# Altium footprint library 7-Connectors-12.PcbLib: 76 footprints (part 3 of 5) (continued)
## MOLEX_47082-1000 [mm] "1.27mm (.050\") Pitch, Surface Mount with Shell, Right Angle, External Metal-Shielded, Serial ATA Plug (SATA)" (continued)
Mechanical 8:
  circle w0.1: c-7.2,-1.935 r0.7
  circle w0.1: c7.2,-2.835 r0.85
  circle w0.1: c9.02,-8.435 r0.85
  circle w0.1: c9.02,0.515 r0.85
  circle w0.1: c-9.38,0.515 r0.85
  circle w0.1: c-9.38,-8.435 r0.85
  circle w0.1: c9.02,0.515 r1.2
  circle w0.1: c-9.38,0.515 r1.2
  circle w0.1: c-9.38,-8.435 r1.2
  circle w0.1: c9.02,-8.435 r1.2
  circle w0.1: c-7.2,-1.935 r1.05
  lines w0.1: -9.88,-8.435 -9.38,-8.435 ; -9.88,0.515 -9.38,0.515 ; -9.38,-8.935 -9.38,-8.435 ; -9.38,-7.935 -9.38,-8.435 ; -9.38,0.015 -9.38,0.515 ; -9.38,1.015 -9.38,0.515 ; -8.88,-8.435 -9.38,-8.435 ; -8.88,0.515 -9.38,0.515 ; -7.7,-1.935 -7.2,-1.935 ; -7.2,-2.435 -7.2,-1.935 ; -7.2,-1.435 -7.2,-1.935 ; -6.7,-1.935 -7.2,-1.935 ; -4.31,0 -3.81,0 ; -3.81,-0.5 -3.81,0 ; -3.81,0.5 -3.81,0 ; -3.31,0 -3.81,0 ; -3.04,0 -2.54,0 ; -2.54,-0.5 -2.54,0 ; -2.54,0.5 -2.54,0 ; -2.04,0 -2.54,0 ; -1.77,0 -1.27,0 ; -1.27,-0.5 -1.27,0 ; -1.27,0.5 -1.27,0 ; -0.77,0 -1.27,0 ; -0.5,0 0,0 ; 0,-0.5 0,0 ; 0,0.5 0,0 ; 0.5,0 0,0 ; 0.77,0 1.27,0 ; 1.27,-0.5 1.27,0 ; 1.27,0.5 1.27,0 ; 1.77,0 1.27,0 ; 2.04,0 2.54,0 ; 2.54,-0.5 2.54,0 ; 2.54,0.5 2.54,0 ; 3.04,0 2.54,0 ; 3.31,0 3.81,0 ; 3.81,-0.5 3.81,0 ; 3.81,0.5 3.81,0 ; 4.31,0 3.81,0 ; 6.7,-2.835 7.2,-2.835 ; 7.2,-3.335 7.2,-2.835 ; 7.2,-2.335 7.2,-2.835 ; 7.7,-2.835 7.2,-2.835 ; 8.52,-8.435 9.02,-8.435 ; 8.52,0.515 9.02,0.515 ; 9.02,-8.935 9.02,-8.435 ; 9.02,-7.935 9.02,-8.435 ; 9.02,0.015 9.02,0.515 ; 9.02,1.015 9.02,0.515 ; 9.52,-8.435 9.02,-8.435 ; 9.52,0.515 9.02,0.515 ; -4.11,-0.835 -4.11,0.865 -3.51,0.865 -3.51,-0.835 -4.11,-0.835 ; -2.84,-0.835 -2.24,-0.835 -2.24,0.865 -2.84,0.865 -2.84,-0.835 ; -1.57,-0.835 -0.97,-0.835 -0.97,0.865 -1.57,0.865 -1.57,-0.835 ; -0.3,-0.835 0.3,-0.835 0.3,0.865 -0.3,0.865 -0.3,-0.835 ; 0.97,-0.835 1.57,-0.835 1.57,0.865 0.97,0.865 0.97,-0.835 ; 2.24,-0.835 2.84,-0.835 2.84,0.865 2.24,0.865 2.24,-0.835 ; 3.51,-0.835 4.11,-0.835 4.11,0.865 3.51,0.865 3.51,-0.835
Mechanical 14:
  circle w0.25: c-3.844,1.411 r0.125
  lines w0.1: -9.58,-11.53 -8.835,-11.53 -8.83,-11.535 4.52,-11.535 4.525,-11.53 9.22,-11.53 ; -9.58,0.12 -8.08,0.12 ccw(c-8.08,0.32) -7.88,0.32 ; -3.68,-11.535 -3.68,-11.93 -5.862,-11.93 ccw(c-5.862,-12.83) -6.533,-12.23 cw(c-6.98,-11.83) -7.536,-12.055 -7.907,-12.205 ccw(c-6.98,-11.83) -6.235,-12.497 cw(c-5.862,-12.83) -5.862,-12.33 5.502,-12.33 cw(c5.502,-12.83) 5.875,-12.497 ccw(c6.62,-11.83) 7.547,-12.205 7.176,-12.055 cw(c6.62,-11.83) 6.173,-12.23 ccw(c5.502,-12.83) 5.502,-11.93 3.32,-11.93 3.32,-11.535 ; 5.52,0.52 0.82,0.52 0.82,0.32 ccw(c1.02,0.32) 0.844,0.225 5.496,0.225 ccw(c5.32,0.32) 5.52,0.32 5.52,0.92 ; 5.688,-12.663 ccw(c6.62,-11.83) 7.779,-12.298 ; 8.82,-11.53 8.82,-11.73 ccw(c9.42,-11.73) 9.42,-12.33 10.37,-12.33 10.37,-11.93 9.42,-11.93 cw(c9.42,-11.73) 9.22,-11.73 9.22,1.27 8.82,1.27 8.82,0.286 ccw(c8.62,-0.28) 8.62,0.32 7.52,0.32 ; 9.22,0.12 7.72,0.12 cw(c7.72,0.32) 7.52,0.32 ; -9.18,-11.73 cw(c-9.78,-11.73) -9.78,-12.33 -10.73,-12.33 -10.73,-11.93 -9.78,-11.93 ccw(c-9.78,-11.73) -9.58,-11.73 -9.58,1.27 -9.18,1.27 -9.18,0.286 cw(c-8.98,-0.28) -8.98,0.32 -7.88,0.32 ; -9.18,-11.73 -9.18,-11.53 -9.18,-11.73 ; -7.88,0.32 -7.88,0.52 -8.779,0.52 -8.779,0.92 8.42,0.92 8.42,0.52 7.52,0.52 7.52,0.32 ; -4.73,-10.73 ccw(c-4.53,-10.73) -4.53,-10.93 ; -4.73,-10.73 ccw(c-4.53,-10.73) -4.53,-10.93 ; -4.73,-10.73 -4.73,-5.13 ; -4.73,-10.73 -4.73,-5.13 ; -4.73,-5.13 cw(c-4.53,-5.13) -4.33,-5.13 ; -4.73,-5.13 cw(c-4.53,-5.13) -4.33,-5.13 ; -4.53,-10.93 -2.63,-10.93 ; -4.53,-10.93 -2.63,-10.93 ; -4.33,-9.759 ccw(c-4.13,-9.759) -4.13,-9.959 ; -4.33,-9.759 ccw(c-4.13,-9.759) -4.13,-9.959 ; -4.33,-9.759 -4.33,-5.13 ; -4.33,-9.759 -4.33,-5.13 ; -4.13,-9.959 -3.03,-9.959 ; -4.13,-9.959 -3.03,-9.959 ; -3.03,-9.959 ccw(c-3.03,-9.759) -2.83,-9.759 ; -3.03,-9.959 ccw(c-3.03,-9.759) -2.83,-9.759 ; -2.83,-9.759 -2.83,-5.13 ; -2.83,-9.759 -2.83,-5.13 ; -2.83,-5.13 cw(c-2.63,-5.13) -2.43,-5.13 ; -2.83,-5.13 cw(c-2.63,-5.13) -2.43,-5.13 ; -2.63,-10.93 ccw(c-2.63,-10.73) -2.43,-10.73 ; -2.63,-10.93 ccw(c-2.63,-10.73) -2.43,-10.73 ; -2.43,-10.73 -2.43,-5.13 ; -2.43,-10.73 -2.43,-5.13 ; -2.43,-10.73 -2.43,-5.13 ; -2.43,-10.73 -2.43,-5.13 ; 2.07,-10.73 ccw(c2.27,-10.73) 2.27,-10.93 ; 2.07,-10.73 ccw(c2.27,-10.73) 2.27,-10.93 ; 2.07,-10.73 2.07,-5.13 ; 2.07,-10.73 2.07,-5.13 ; 2.07,-5.13 cw(c2.27,-5.13) 2.47,-5.13 ; 2.07,-5.13 cw(c2.27,-5.13) 2.47,-5.13 ; 2.27,-10.93 4.17,-10.93 ; 2.27,-10.93 4.17,-10.93 ; 2.47,-9.759 ccw(c2.67,-9.759) 2.67,-9.959 ; 2.47,-9.759 ccw(c2.67,-9.759) 2.67,-9.959 ; 2.47,-9.759 2.47,-5.13 ; 2.47,-9.759 2.47,-5.13 ; 2.67,-9.959 3.77,-9.959 ; 2.67,-9.959 3.77,-9.959 ; 3.77,-9.959 ccw(c3.77,-9.759) 3.97,-9.759 ; 3.77,-9.959 ccw(c3.77,-9.759) 3.97,-9.759 ; 3.97,-9.759 3.97,-5.13 ; 3.97,-9.759 3.97,-5.13 ; 3.97,-5.13 cw(c4.17,-5.13) 4.37,-5.13 ; 3.97,-5.13 cw(c4.17,-5.13) 4.37,-5.13 ; 4.17,-10.93 ccw(c4.17,-10.73) 4.37,-10.73 ; 4.17,-10.93 ccw(c4.17,-10.73) 4.37,-10.73 ; 4.37,-10.73 4.37,-5.13 ; 4.37,-10.73 4.37,-5.13 ; 4.37,-10.73 4.37,-5.13 ; 4.37,-10.73 4.37,-5.13 ; -5.88,0.32 ccw(c-5.68,0.32) -5.856,0.225 -1.204,0.225 ccw(c-1.38,0.32) -1.18,0.32 -1.18,0.52 -5.88,0.52 -5.88,0.32
Mechanical 15:
  lines w0.1: -10.98,-13.08 -10.98,1.965 10.62,1.965 10.62,-13.08 -10.98,-13.08
3D body "MOLEX_47082-1000.stp": height 6.9, standoff -2.1, extent -10.73,-12.828 10.37,1.27

## MOLEX_53261-0271 [mm] "1.25mm (.049\") Pitch PicoBlade Header, Surface Mount, Right Angle, 2 Circuits"
height 3.4
pads (4):
  rect 0.8x1.6 smd: 1(-0.625,2.9) 2(0.625,2.9)
  rect 2.1x3 smd: MEC1(-3.175,0) MEC2(3.175,0)
Top Overlay:
  lines w0.2: -2.125,-1.8 -2.125,-2.1 -0.15,-2.1 -0.15,-0.75 -0.425,-0.75 -0.425,-1.1 ; -2.125,1.8 -2.125,2.1 -1.325,2.1 ; -1.825,-1.2 -1.225,-1.2 -1.225,-0.6 1.225,-0.6 1.225,-1.2 1.825,-1.2 ; -1.825,1.5 -1.625,1.5 -1.625,2.1 ; -1.725,-2.1 -1.525,-1.9 ; -1.525,-1.2 -1.525,-1.9 ; -0.875,1.8 -0.875,1.5 -0.375,1.5 -0.375,1.8 ; -0.825,-0.6 -0.825,-1.1 ; -0.15,-1.9 -1.525,-1.9 ; 0.15,-1.9 1.525,-1.9 ; 0.375,1.8 0.375,1.5 0.875,1.5 0.875,1.8 ; 0.825,-0.6 0.825,-1.1 ; 1.325,2.1 2.125,2.1 2.125,1.8 ; 1.525,-1.2 1.525,-1.9 ; 1.625,2.1 1.625,1.5 1.825,1.5 ; 1.725,-2.1 1.525,-1.9 ; 2.125,-1.8 2.125,-2.1 0.15,-2.1 0.15,-0.75 0.425,-0.75 0.425,-1.1 ; -0.825,-1.1 -0.425,-1.1 ; -0.825,-1.1 -0.725,-1.6 -0.525,-1.6 -0.425,-1.1 ; 0.425,-1.1 0.525,-1.6 0.725,-1.6 0.825,-1.1 ; 0.425,-1.1 0.825,-1.1
  text "1" at -1.8,2.5 h1
Mechanical 8:
  lines w0.1: -3.675,0 -3.175,0 ; -3.175,-0.5 -3.175,0 ; -3.175,0.5 -3.175,0 ; -2.675,0 -3.175,0 ; -1.125,2.9 -0.625,2.9 ; -0.625,2.4 -0.625,2.9 ; -0.625,3.4 -0.625,2.9 ; -0.5,0 0,0 ; -0.125,2.9 -0.625,2.9 ; 0,-0.5 0,0 ; 0,0.5 0,0 ; 0.125,2.9 0.625,2.9 ; 0.5,0 0,0 ; 0.625,2.4 0.625,2.9 ; 0.625,3.4 0.625,2.9 ; 1.125,2.9 0.625,2.9 ; 2.675,0 3.175,0 ; 3.175,-0.5 3.175,0 ; 3.175,0.5 3.175,0 ; 3.675,0 3.175,0 ; -4.225,-1.5 -4.225,1.5 -2.125,1.5 -2.125,-1.5 -4.225,-1.5 ; -1.025,2.1 -0.225,2.1 -0.225,3.7 -1.025,3.7 -1.025,2.1 ; 0.225,2.1 0.225,3.7 1.025,3.7 1.025,2.1 0.225,2.1 ; 2.125,-1.5 4.225,-1.5 4.225,1.5 2.125,1.5 2.125,-1.5
Mechanical 14:
  lines w0.1: -3.625,-1.1 -3.825,-0.9 -3.825,0.9 -3.625,1.1 ; -3.325,-1.7 -3.325,1.1 ; -2.525,-1.7 -2.525,1.1 ; -2.145,1.1 -3.625,1.1 ; -2.125,-1.7 -3.625,-1.7 -3.625,1.1 ; -2.125,-1.2 -1.225,-1.2 -1.225,-0.6 1.225,-0.6 1.225,-1.2 2.125,-1.2 ; -2.125,1.5 -1.625,1.5 -1.625,2.1 ; -1.725,-2.1 -1.525,-1.9 ; -1.525,-1.2 -1.525,-1.9 ; -0.875,2.1 -0.875,1.5 -0.375,1.5 -0.375,2.1 ; -0.825,-0.6 -0.825,-1.1 ; -0.785,2.1 -0.785,3.1 -0.465,3.1 -0.465,2.1 ; -0.15,-1.9 -1.525,-1.9 ; 0.15,-1.9 1.525,-1.9 ; 0.375,2.1 0.375,1.5 0.875,1.5 0.875,2.1 ; 0.465,2.1 0.465,3.1 0.785,3.1 0.785,2.1 ; 0.825,-0.6 0.825,-1.1 ; 1.525,-1.2 1.525,-1.9 ; 1.625,2.1 1.625,1.5 2.125,1.5 ; 1.725,-2.1 1.525,-1.9 ; 2.125,-1.7 3.625,-1.7 3.625,1.1 ; 2.125,1.1 3.625,1.1 ; 2.525,-1.7 2.525,1.1 ; 3.325,-1.7 3.325,1.1 ; 3.625,-1.1 3.825,-0.9 3.825,0.9 3.625,1.1 ; -0.825,-1.1 -0.425,-1.1 ; -0.825,-1.1 -0.725,-1.6 -0.525,-1.6 -0.425,-1.1 ; -0.425,-1.1 -0.425,-0.75 -0.15,-0.75 -0.15,-2.1 -2.125,-2.1 -2.125,2.1 2.125,2.1 2.125,-2.1 0.15,-2.1 0.15,-0.75 0.425,-0.75 0.425,-1.1 ; 0.425,-1.1 0.525,-1.6 0.725,-1.6 0.825,-1.1 ; 0.425,-1.1 0.825,-1.1
  text "1" at -1.8,2.5 h1
3D body "MOLEX_53261-0271.stp": height 3.4, standoff 0, extent -3.825,-2.1 3.825,3.1
3D body "p160-080.stp": height 0.02, standoff 0, extent -1.035,2.121 -0.235,3.721
3D body "p160-080.stp": height 0.02, standoff 0, extent 0.235,2.121 1.035,3.721
3D body "p300-210.stp": height 0.02, standoff 0, extent 2.125,-1.5 4.225,1.5
3D body "p300-210.stp": height 0.02, standoff 0, extent -4.225,-1.5 -2.125,1.5

## MOLEX_78171-0004 [mm] "1.20mm Pitch Pico-EZmate Wire-to-Board Header, Vertical, Housing Height: 1.55mm, with Side-Friction Locks, 4 Circuits"
height 1.55
pads (6):
  rect 0.6x0.85 smd: 1(-1.8,-0.01) 2(-0.6,-0.01) 3(0.6,-0.01) 4(1.8,-0.01)
  rect 0.7x0.8 smd: 5(2.89,-3.788) 6(-2.95,-3.788)
Top Overlay:
  circle w0.25: c-1.8,1.075 r0.125
  lines w0.2: -3.3,-2.99 -3.3,0.16 -2.5,0.16 ; -2.85,-2.99 -2.85,-2.69 -2.6,-2.69 -2.6,-2.19 -2.85,-2.19 -2.85,-1.67 -2.49,-1.67 -2.49,-1.24 -2.84,-1.24 -2.84,-0.64 -2.5,-0.64 ; -2.2,-4.34 -1.95,-4.34 -1.41,-3.66 1.41,-3.66 1.95,-4.34 2.14,-4.34 ; -2.1,-4.34 -2.1,-1.47 2.1,-1.47 2.1,-4.34 ; 2.5,-0.64 2.84,-0.64 2.84,-1.24 2.49,-1.24 2.49,-1.67 2.85,-1.67 2.85,-2.19 2.6,-2.19 2.6,-2.69 2.85,-2.69 2.85,-2.99 ; 2.5,0.16 3.3,0.16 3.3,-2.99
Mechanical 7:
  lines w0.1: -2.85,-1.67 -2.49,-1.67
Mechanical 8:
  lines w0.1: -0.5,0 0,0 ; 0,-0.5 0,0 ; 0,0.5 0,0 ; 0.5,0 0,0 ; -3.3,-4.185 -2.95,-3.788 -2.6,-4.185 ; -3.3,-4.185 -3.3,-3.39 -2.6,-3.39 -2.6,-4.185 ; -3.3,-4.185 -2.6,-4.185 ; -2.1,-0.435 -1.5,-0.435 ; -2.1,-0.435 -2.1,0.415 -1.5,0.415 -1.5,-0.435 ; -2.1,-0.435 -1.8,-0.01 -1.5,-0.435 ; -0.9,-0.435 -0.3,-0.435 ; -0.9,-0.435 -0.9,0.415 -0.3,0.415 -0.3,-0.435 ; -0.9,-0.435 -0.6,-0.01 -0.3,-0.435 ; 0.3,-0.435 0.9,-0.435 ; 0.3,-0.435 0.3,0.415 0.9,0.415 0.9,-0.435 ; 0.3,-0.435 0.6,-0.01 0.9,-0.435 ; 1.5,-0.435 2.1,-0.435 ; 1.5,-0.435 1.5,0.415 2.1,0.415 2.1,-0.435 ; 1.5,-0.435 1.8,-0.01 2.1,-0.435 ; 2.54,-4.185 2.89,-3.788 3.24,-4.185 ; 2.54,-4.185 2.54,-3.39 3.24,-3.39 3.24,-4.185 ; 2.54,-4.185 3.24,-4.185
Mechanical 14:
  lines w0.1: -3.3,-3.44 -2.6,-3.44 ; -3.3,-3.34 -2.5,-3.34 -2.6,-3.44 ; -3.07,-3.24 -3.07,-1.67 ; -2.89,-3.24 -2.89,-1.67 ; -2.85,-3.24 -2.85,-2.69 -2.6,-2.69 -2.6,-2.19 -2.85,-2.19 -2.85,-1.67 ; -2.69,-1.67 -2.69,-1.44 ; -2.6,-4.34 -2.6,-3.44 ; -2.5,-4.34 -2.5,-3.24 -3.1,-3.24 -3.1,-1.67 -2.49,-1.67 -2.49,-1.24 ; -2.1,-4.34 -2.1,-1.47 2.1,-1.47 2.1,-4.34 ; 2.5,-4.34 2.5,-3.24 3.1,-3.24 3.1,-1.67 2.49,-1.67 2.49,-1.24 ; 2.6,-4.34 2.6,-3.44 ; 2.69,-1.67 2.69,-1.44 ; 2.85,-3.24 2.85,-1.67 ; 2.85,-2.69 2.6,-2.69 2.6,-2.19 2.85,-2.19 ; 2.89,-3.24 2.89,-1.67 ; 3.3,-3.44 2.6,-3.44 ; 3.3,-3.34 2.5,-3.34 2.6,-3.44 ; -3.04,-1.44 -2.69,-1.44 ; -3.04,-1.44 -2.84,-1.24 ; -3.04,-1.44 -3.04,-0.44 ; -3.04,-0.44 3.04,-0.44 ; -3.04,-0.44 -2.84,-0.64 ; -2.84,-1.24 -2.84,-0.64 ; -2.84,-1.24 -2.49,-1.24 ; -2.84,-0.64 2.84,-0.64 ; -2.69,-1.44 -2.49,-1.24 ; 2.49,-1.24 2.84,-1.24 ; 2.49,-1.24 2.69,-1.44 ; 2.69,-1.44 3.04,-1.44 ; 2.84,-1.24 2.84,-0.64 ; 2.84,-1.24 3.04,-1.44 ; 2.84,-0.64 3.04,-0.44 ; 3.04,-1.44 3.04,-0.44 ; -3.3,-4.34 -1.95,-4.34 -1.41,-3.66 1.41,-3.66 1.95,-4.34 3.3,-4.34 3.3,0.16 -3.3,0.16 -3.3,-4.34 ; -3.02,-4.17 -3.02,-3.5 -2.82,-3.5 -2.82,-4.17 -3.02,-4.17 ; 2.82,-4.17 3.02,-4.17 3.02,-3.5 2.82,-3.5 2.82,-4.17
Mechanical 15:
  lines w0.05: -3.55,-4.59 -3.55,0.665 3.55,0.665 3.55,-4.59 -3.55,-4.59
3D body "MOLEX_78171-0004.stp": height 1.45, standoff 0, extent -3.3,-4.34 3.3,0.19

## MOLEX_500075-1517 [mm] "Straight, USB Serie Mini-B Type 2 Through Hole Receptacle"
height 7.7
pads (7):
  round 1.25 hole 0.7: 1(1.6,1.3) 2(0.8,-1.3) 3(0,1.3) 4(-0.8,-1.3) 5(-1.6,1.3)
  oval 1.4x3.9 hole 0.7 slot 2.4 at 90 deg: 6(-3.65,0) 6(3.65,0)
Top Overlay:
  lines w0.2: -3.322,2.3 3.322,2.3 ; -2.9,-2.055 -2.9,-2.4 -2.25,-2.4 -2.25,-1.9 ; -2.763,-1.9 -1.6,-1.9 ; -2.189,0.492 -2.3,0.3 -2.3,-0.3 -2.2,-0.4 -1.236,-0.4 ; -0.364,-0.4 0.364,-0.4 ; 1.236,-0.4 2.2,-0.4 ; 1.6,-1.9 2.763,-1.9 ; 2.189,0.492 2.3,0.3 2.3,-0.3 ; 2.25,-1.9 2.25,-2.4 2.9,-2.4 2.9,-2.055 ; 2.2,-0.4 2.3,-0.3 ; 2.2,-0.4 2.3,-0.3 ; -1.825,-0.1 -1.425,-0.1 -1.425,0.5 -1.825,0.5 -1.825,-0.1 ; -1,-0.1 -0.6,-0.1 -0.6,0.5 -1,0.5 -1,-0.1 ; -0.225,-0.1 0.175,-0.1 0.175,0.5 -0.225,0.5 -0.225,-0.1 ; 0.6,-0.1 1,-0.1 1,0.5 0.6,0.5 0.6,-0.1 ; 1.4,-0.1 1.8,-0.1 1.8,0.5 1.4,0.5 1.4,-0.1
Mechanical 8:
  lines w0.1: -4.15,0 -3.65,0 ; -3.65,-0.5 -3.65,0 ; -3.65,0.5 -3.65,0 ; -3.15,0 -3.65,0 ; -2.1,1.3 -1.6,1.3 ; -1.6,0.8 -1.6,1.3 ; -1.6,1.8 -1.6,1.3 ; -1.3,-1.3 -0.8,-1.3 ; -1.1,1.3 -1.6,1.3 ; -0.8,-1.8 -0.8,-1.3 ; -0.8,-0.8 -0.8,-1.3 ; -0.5,0 0,0 ; -0.5,1.3 0,1.3 ; -0.3,-1.3 -0.8,-1.3 ; 0,-0.5 0,0 ; 0,0.5 0,0 ; 0,0.8 0,1.3 ; 0,1.8 0,1.3 ; 0.3,-1.3 0.8,-1.3 ; 0.5,0 0,0 ; 0.5,1.3 0,1.3 ; 0.8,-1.8 0.8,-1.3 ; 0.8,-0.8 0.8,-1.3 ; 1.1,1.3 1.6,1.3 ; 1.3,-1.3 0.8,-1.3 ; 1.6,0.8 1.6,1.3 ; 1.6,1.8 1.6,1.3 ; 2.1,1.3 1.6,1.3 ; 3.15,0 3.65,0 ; 3.65,-0.5 3.65,0 ; 3.65,0.5 3.65,0 ; 4.15,0 3.65,0 ; -4.35,-1.25 ccw(c-3.65,-1.25) -2.95,-1.25 -2.95,1.25 ccw(c-3.65,1.25) -4.35,1.25 -4.35,-1.25 ; -3.975,-0.875 ccw(c-3.65,-0.875) -3.325,-0.875 -3.325,0.875 ccw(c-3.65,0.875) -3.975,0.875 -3.975,-0.875 ; 2.95,-1.25 ccw(c3.65,-1.25) 4.35,-1.25 4.35,1.25 ccw(c3.65,1.25) 2.95,1.25 2.95,-1.25 ; 3.325,-0.875 ccw(c3.65,-0.875) 3.975,-0.875 3.975,0.875 ccw(c3.65,0.875) 3.325,0.875 3.325,-0.875
Mechanical 14:
  lines w0.1: -3.45,0.288 -3.45,2.3 3.45,2.3 3.45,0.288 ; -3.45,2.05 -3.55,2.05 ccw(c-3.55,1.75) -3.85,1.75 -3.85,-0.403 ; -2.9,-1.9 -2.9,-2.4 -2.25,-2.4 -2.25,-1.9 ; 2.25,-1.9 2.25,-2.4 2.9,-2.4 2.9,-1.9 ; 3.45,2.05 3.55,2.05 cw(c3.55,1.75) 3.85,1.75 3.85,-0.403 ; -3.85,-0.403 cw(c-3.15,-0.403) -3.647,0.089 -3.422,0.317 ccw(c-3.635,0.528) -3.335,0.528 -3.335,1.3 cw(c-2.635,1.3) -2.635,2 2.635,2 cw(c2.635,1.3) 3.335,1.3 3.335,0.528 ccw(c3.635,0.528) 3.422,0.317 3.647,0.089 cw(c3.15,-0.403) 3.85,-0.403 ; -3.85,-0.403 -3.85,-1.2 ccw(c-3.15,-1.2) -3.15,-1.9 3.15,-1.9 ccw(c3.15,-1.2) 3.85,-1.2 3.85,-0.403 ; 2.2,-0.4 2.3,-0.3 ; 2.2,-0.4 -2.2,-0.4 -2.3,-0.3 -2.3,0.3 -1.838,1.1 -1.318,1.1 -1.118,0.9 1.118,0.9 1.318,1.1 1.838,1.1 2.3,0.3 2.3,-0.3 ; 2.2,-0.4 2.3,-0.3 ; -3.45,-1.2 ccw(c-3.15,-1.2) -3.15,-1.5 3.15,-1.5 ccw(c3.15,-1.2) 3.45,-1.2 3.45,-0.403 ccw(c3.15,-0.403) 3.363,-0.192 3.138,0.035 cw(c3.635,0.528) 2.935,0.528 2.935,1.3 ccw(c2.635,1.3) 2.635,1.6 -2.635,1.6 ccw(c-2.635,1.3) -2.935,1.3 -2.935,0.528 cw(c-3.635,0.528) -3.138,0.035 -3.363,-0.192 ccw(c-3.15,-0.403) -3.45,-0.403 -3.45,-1.2 ; -1.825,-0.1 -1.425,-0.1 -1.425,0.5 -1.825,0.5 -1.825,-0.1 ; -1,-0.1 -0.6,-0.1 -0.6,0.5 -1,0.5 -1,-0.1 ; -0.225,-0.1 0.175,-0.1 0.175,0.5 -0.225,0.5 -0.225,-0.1 ; 0.6,-0.1 1,-0.1 1,0.5 0.6,0.5 0.6,-0.1 ; 1.4,-0.1 1.8,-0.1 1.8,0.5 1.4,0.5 1.4,-0.1
3D body "MOLEX_500075-1517.stp": height 7.7, standoff -2.1, extent -3.85,-2.4 3.85,2.3

## MOLEX_500254-1927 [mm] "19 Contacts, Pitch 0.5mm, Right Angle, HDMI Receptacle"
height 6.18
pads (23):
  rect 0.28x2.6 smd: 1(4.5,0) 2(4,0) 3(3.5,0) 4(3,0) 5(2.5,0) 6(2,0) 7(1.5,0) 8(1,0) 9(0.5,0) 10(0,0) 11(-0.5,0) 12(-1,0) 13(-1.5,0) 14(-2,0) 15(-2.5,0) 16(-3,0) 17(-3.5,0) 18(-4,0) 19(-4.5,0)
  oval 1.5x2.7 hole 0.9 slot 2.1 at 90 deg: SHIELD(-7.25,-6.72) SHIELD(7.25,-6.72)
  oval 1.5x3.3 hole 0.9 slot 2.7 at 90 deg: SHIELD(-7.25,-0.76) SHIELD(7.25,-0.76)
Top Overlay:
  circle w0.25: c5.225,1.075 r0.125
  lines w0.2: -7.5,-8.34 -7.5,-11.31 7.5,-11.31 7.5,-8.34 ; -7.5,-5.1 -7.5,-2.68 ; -6.5,-11.31 -6.5,-8.055 ; -6.5,-5.385 -6.5,-2.395 ; -6.467,0.84 -5.8,0.84 -5.8,-1.66 ; -6.388,0.74 -5.8,0.74 ; -6.2,-1.66 -5.8,-1.66 ; -6.2,-0.16 -5.8,-0.16 ; -5.8,-0.26 -4.94,-0.26 ; -5.6,-0.26 -5.6,-0.71 -4.94,-0.71 ; -4.94,-0.76 -5.6,-0.76 -5.6,-1.46 cw(c-5.8,-1.46) -5.8,-1.66 ; 4.94,-0.76 5.6,-0.76 5.6,-1.46 ccw(c5.8,-1.46) 5.8,-1.66 ; 4.94,-0.71 5.6,-0.71 5.6,-0.26 ; 4.94,-0.26 5.8,-0.26 ; 5.8,-0.16 6.2,-0.16 ; 5.8,0.74 6.388,0.74 ; 5.8,1.09 6.467,1.09 ; 6.2,-1.66 5.8,-1.66 ; 6.467,0.84 5.8,0.84 5.8,-1.66 ; 6.5,-11.31 6.5,-8.055 ; 6.5,-5.385 6.5,-2.395 ; 7.5,-5.1 7.5,-2.68
Mechanical 8:
  lines w0.1: -8,-10.31 0,-10.31 8,-10.31 ; -7.75,-7.32 -7.25,-7.32 ; -7.75,-6.72 -7.25,-6.72 ; -7.75,-6.12 -7.25,-6.12 ; -7.75,-1.66 -7.25,-1.66 ; -7.75,-0.76 -7.25,-0.76 ; -7.75,0.14 -7.25,0.14 ; -7.25,-7.82 -7.25,-7.32 ; -7.25,-7.22 -7.25,-6.72 ; -7.25,-6.22 -7.25,-6.72 ; -7.25,-5.62 -7.25,-6.12 ; -7.25,-2.16 -7.25,-1.66 ; -7.25,-1.26 -7.25,-0.76 ; -7.25,-0.26 -7.25,-0.76 ; -7.25,0.64 -7.25,0.14 ; -6.75,-7.32 -7.25,-7.32 ; -6.75,-6.72 -7.25,-6.72 ; -6.75,-6.12 -7.25,-6.12 ; -6.75,-1.66 -7.25,-1.66 ; -6.75,-0.76 -7.25,-0.76 ; -6.75,0.14 -7.25,0.14 ; -5,0 -4.5,0 ; -4.5,-0.5 -4.5,0 ; -4.5,0.5 -4.5,0 ; -4,-0.5 -4,0 -4,0.5 ; -3.5,-0.5 -3.5,0 -3.5,0.5 ; -3,-0.5 -3,0 -3,0.5 ; -2.5,-0.5 -2.5,0 -2.5,0.5 ; -2,-0.5 -2,0 -2,0.5 ; -1.5,-0.5 -1.5,0 -1.5,0.5 ; -1,-0.5 -1,0 -1,0.5 ; -0.5,-0.5 -0.5,0 -0.5,0.5 ; -0.354,-0.354 0,0 ; -0.354,0.354 0,0 ; 0,-0.5 0,0 ; 0,0.5 0,0 ; 0.354,-0.354 0,0 ; 0.354,0.354 0,0 ; 0.5,-0.5 0.5,0 0.5,0.5 ; 1,-0.5 1,0 1,0.5 ; 1.5,-0.5 1.5,0 1.5,0.5 ; 2,-0.5 2,0 2,0.5 ; 2.5,-0.5 2.5,0 2.5,0.5 ; 3,-0.5 3,0 3,0.5 ; 3.5,-0.5 3.5,0 3.5,0.5 ; 4,-0.5 4,0 4,0.5 ; 4.5,-0.5 4.5,0 ; 4.5,0.5 4.5,0 ; 5,0 4.5,0 ; 6.75,-7.32 7.25,-7.32 ; 6.75,-6.72 7.25,-6.72 ; 6.75,-6.12 7.25,-6.12 ; 6.75,-1.66 7.25,-1.66 ; 6.75,-0.76 7.25,-0.76 ; 6.75,0.14 7.25,0.14 ; 7.25,-7.82 7.25,-7.32 ; 7.25,-7.22 7.25,-6.72 ; 7.25,-6.22 7.25,-6.72 ; 7.25,-5.62 7.25,-6.12 ; 7.25,-2.16 7.25,-1.66 ; 7.25,-1.26 7.25,-0.76 ; 7.25,-0.26 7.25,-0.76 ; 7.25,0.64 7.25,0.14 ; 7.75,-7.32 7.25,-7.32 ; 7.75,-6.72 7.25,-6.72 ; 7.75,-6.12 7.25,-6.12 ; 7.75,-1.66 7.25,-1.66 ; 7.75,-0.76 7.25,-0.76 ; 7.75,0.14 7.25,0.14 ; -4.5,0 4.5,0 ; 4.64,-1.3 4.64,1.3 ; 4.64,-1.3 4.36,-1.3 4.36,1.3 4.64,1.3 ; 4.64,-1.3 4.64,1.3 ; 4.64,-1.3 4.64,1.3 ; 4.64,-1.3 4.64,1.3 ; 4.64,-1.3 4.64,1.3 ; 4.64,-1.3 4.64,1.3 ; 4.64,-1.3 4.64,1.3 ; 4.64,-1.3 4.64,1.3 ; 4.64,-1.3 4.64,1.3 ; 4.64,-1.3 4.64,1.3 ; 4.64,-1.3 4.64,1.3 ; -8,-7.32 ccw(c-7.25,-7.32) -6.5,-7.32 -6.5,-6.12 ccw(c-7.25,-6.12) -8,-6.12 -8,-7.32 ; -8,-1.66 ccw(c-7.25,-1.66) -6.5,-1.66 -6.5,0.14 ccw(c-7.25,0.14) -8,0.14 -8,-1.66 ; -7.7,-7.32 ccw(c-7.25,-7.32) -6.8,-7.32 -6.8,-6.12 ccw(c-7.25,-6.12) -7.7,-6.12 -7.7,-7.32 ; -7.7,-1.66 ccw(c-7.25,-1.66) -6.8,-1.66 -6.8,0.14 ccw(c-7.25,0.14) -7.7,0.14 -7.7,-1.66 ; -4.64,-1.3 -4.36,-1.3 -4.36,1.3 -4.64,1.3 -4.64,-1.3 ; 6.5,-7.32 ccw(c7.25,-7.32) 8,-7.32 8,-6.12 ccw(c7.25,-6.12) 6.5,-6.12 6.5,-7.32 ; 6.5,-1.66 ccw(c7.25,-1.66) 8,-1.66 8,0.14 ccw(c7.25,0.14) 6.5,0.14 6.5,-1.66 ; 6.8,-7.32 ccw(c7.25,-7.32) 7.7,-7.32 7.7,-6.12 ccw(c7.25,-6.12) 6.8,-6.12 6.8,-7.32 ; 6.8,-1.66 ccw(c7.25,-1.66) 7.7,-1.66 7.7,0.14 ccw(c7.25,0.14) 6.8,0.14 6.8,-1.66
Mechanical 14:
  lines w0.1: -7.5,-1.66 -5.8,-1.66 ; -7.5,-1.06 -7,-1.06 ; -7.5,-0.66 cw(c-7.15,-0.66) -7.15,-0.31 -7,-0.31 ; -7,-1.66 -7,0.24 -7.5,0.24 -7.5,-11.31 7.5,-11.31 7.5,0.24 7,0.24 7,-1.66 ; -7,-0.16 -5.8,-0.16 ; -6.95,-0.16 -6.95,0.84 ; -6.85,-0.16 -6.85,0.74 ; -6.5,-11.31 -6.5,-1.66 ; -5.8,-0.26 5.8,-0.26 ; -5.8,0.74 -6.85,0.74 ; -5.6,-0.26 -5.6,-0.71 -4.9,-0.71 ; -4.9,-0.26 -4.9,-0.76 -5.6,-0.76 -5.6,-1.46 cw(c-5.8,-1.46) -5.8,-1.66 ; -3.2,-0.71 -1.2,-0.71 ; -3.2,-0.26 -3.2,-1.06 ccw(c-3,-1.06) -3,-1.26 -1.4,-1.26 ccw(c-1.4,-1.06) -1.2,-1.06 -1.2,-0.26 ; 1.2,-0.71 3.2,-0.71 ; 1.2,-0.26 1.2,-1.06 ccw(c1.4,-1.06) 1.4,-1.26 3,-1.26 ccw(c3,-1.06) 3.2,-1.06 3.2,-0.26 ; 4.9,-0.71 5.6,-0.71 5.6,-0.26 ; 4.9,-0.26 4.9,-0.76 5.6,-0.76 5.6,-1.46 ccw(c5.8,-1.46) 5.8,-1.66 ; 5.8,-0.16 7,-0.16 ; 5.8,0.74 6.85,0.74 ; 6.5,-11.31 6.5,-1.66 ; 6.85,-0.16 6.85,0.74 ; 6.95,-0.16 6.95,0.84 ; 7,-1.06 7.5,-1.06 ; 7,-0.31 7.15,-0.31 cw(c7.15,-0.66) 7.5,-0.66 ; 7.5,-1.66 5.8,-1.66 ; -6.95,0.84 -5.8,0.84 -5.8,-1.66 ; -6.95,0.84 -6.85,0.74 ; 5.8,-1.66 5.8,0.84 6.95,0.84 ; 6.85,0.74 6.95,0.84
Mechanical 15:
  lines w0.1: 7.5,-11.56 -7.75,-11.56 -7.75,-8.186 cw(c-7.25,-7.32) -8.25,-7.32 -8.25,-6.12 cw(c-7.25,-6.12) -7.75,-5.254 -7.75,-2.526 cw(c-7.25,-1.66) -8.25,-1.66 -8.25,0.14 cw(c-7.25,0.14) -6.938,1.09 -5.55,1.09 -5.55,-0.01 -4.89,-0.01 -4.89,1.55 4.89,1.55 4.89,-0.01 5.55,-0.01 5.55,1.09 6.938,1.09 cw(c7.25,0.14) 8.25,0.14 8.25,-1.66 cw(c7.25,-1.66) 7.75,-2.526 7.75,-5.254 cw(c7.25,-6.12) 8.25,-6.12 8.25,-7.32 cw(c7.25,-7.32) 7.75,-8.186 7.75,-11.56
3D body "MOLEX_500254-1927.stp": height 6.18, standoff -2.2, extent -7.5,-11.31 7.5,0.84

## MTGP720H320V6P [mm]
pads (1):
  round 7.2 hole 3.25: 1(0,0)
via -2.2,-1.35 diameter 1 hole 0.5
via -2.2,1.375 diameter 1 hole 0.5
via 0,2.525 diameter 1 hole 0.5
via 2.2,1.35 diameter 1 hole 0.5
via 0,-2.625 diameter 1 hole 0.5
via 2.2,-1.35 diameter 1 hole 0.5
Mechanical 8:
  circle w0.1: c0,0 r2.6
  circle w0.1: c0,0 r3.75
  lines w0.1: -2.657,1.625 -2.224,1.375 ; -2.632,-1.6 -2.199,-1.35 ; -2.474,0.942 -2.224,1.375 ; -2.449,-0.917 -2.199,-1.35 ; -1.974,1.808 -2.224,1.375 ; -1.949,-1.783 -2.199,-1.35 ; -1.791,1.125 -2.224,1.375 ; -1.766,-1.1 -2.199,-1.35 ; -0.5,-2.625 0,-2.625 ; -0.5,0 0,0 ; -0.5,2.525 0,2.525 ; 0,-3.125 0,-2.625 ; 0,-2.125 0,-2.625 ; 0,-0.5 0,0 ; 0,0.5 0,0 ; 0,2.025 0,2.525 ; 0,3.025 0,2.525 ; 0.5,-2.625 0,-2.625 ; 0.5,0 0,0 ; 0.5,2.525 0,2.525 ; 1.766,-1.1 2.199,-1.35 ; 1.766,1.1 2.199,1.35 ; 1.949,-1.783 2.199,-1.35 ; 1.949,1.783 2.199,1.35 ; 2.449,-0.917 2.199,-1.35 ; 2.449,0.917 2.199,1.35 ; 2.632,-1.6 2.199,-1.35 ; 2.632,1.6 2.199,1.35
Mechanical 14:
  circle w0.1: c0,0 r3.75
Mechanical 15:
  circle w0.05: c0,0 r3.85
3D body "mtgp720h320v6p.stp": height 0.1, standoff -1.75, extent -3.627,-3.627 3.628,3.628